# Altium footprint library THU VIEN PCB.PCBLib: 534 footprints (part 34 of 34)
Each footprint in its own frame and in the unit in brackets; x right, y up, seen from the top. Pads: shape width x height; smd on the part's side, far side on the other; paste and mask are expansions set on the pad; w line width, h text height; cw(c..) or ccw(c..) is an arc to the next point about the centre after c.
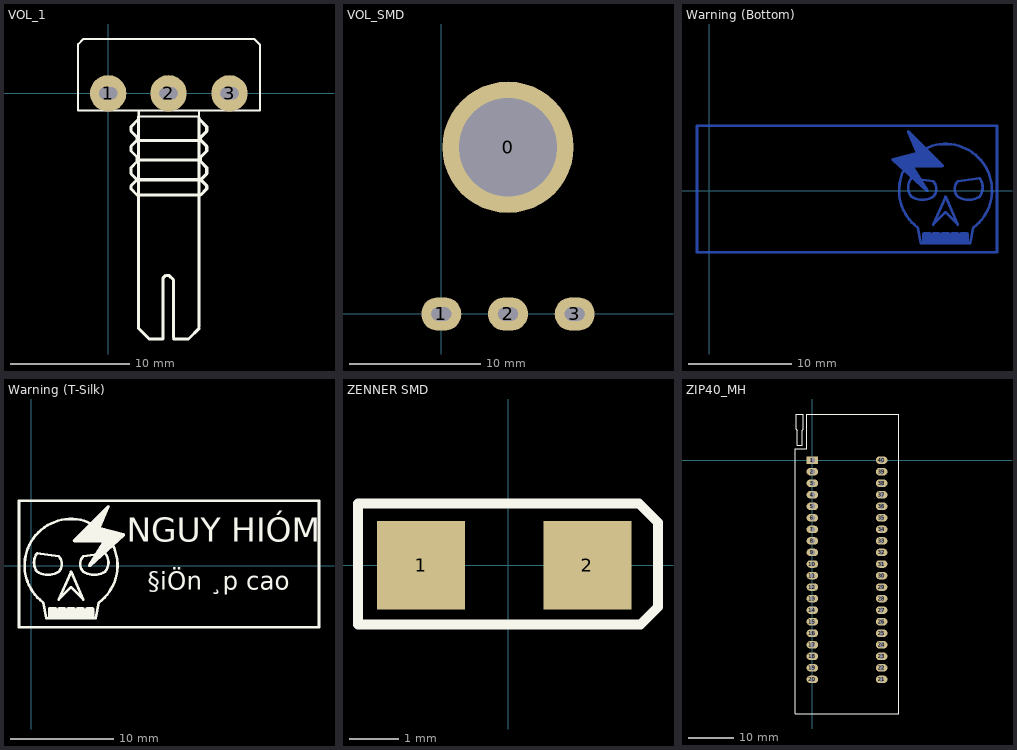
[diagram p33: the footprints below, top view; thin cyan lines are the x and y axes]

## VOL_1 [mil]
pads (3):
  round 120 hole 40 slot 60 at 0 deg: 1(0,0) 2(199,0) 3(400,0)
Top Overlay:
  lines w7: 100,-57 100,-77 299,-77 299,-57 ; 101,-77 101,-57 ; -99,-57 -99,162 -82,179 482,179 500,161 500,-57 -99,-57
  lines w10: 95,-335 75,-315 75,-305 95,-285 75,-265 75,-245 95,-225 95,-210 75,-190 75,-175 95,-155 95,-145 75,-125 75,-110 100,-85 ; 95,-220 300,-220 ; 100,-770 100,-77 ; 100,-760 100,-775 135,-810 180,-810 180,-610 190,-600 200,-600 215,-615 215,-805 ; 100,-335 305,-335 325,-315 325,-305 305,-285 ; 100,-285 305,-285 ; 105,-155 300,-155 ; 215,-810 265,-810 300,-775 ; 300,-770 300,-80 ; 300,-85 325,-110 325,-125 305,-145 305,-155 325,-175 325,-190 305,-210 305,-225 325,-245 325,-265 305,-285
3D body "SW3dPS-Pot.STEP": height 839.35, standoff -130, extent -110,-818.11 510,188.11

## VOL_SMD [mil]
pads (4):
  round 393.7 hole 295.28: 0(200,500)
  oval 120x100 hole 40 slot 60 at 0 deg: 1(0,0) 2(200,0) 3(400,0)
Bottom Overlay:
  circle w12: c200,500 r215.01
  circle w12: c0,150 r50
  circle w12: c200,150 r50
  circle w12: c400,150 r50
  lines w12: -57.25,301.71 cw(c200,500) 455.57,299.55 ; -55,299 127,299 ; -49,700 119,700 ; 281,298 455,298 ; 286,698 454,698 ; 455,295 500,250 500,-75 -100,-75 -100,255 ; -100,255 -55,300 -100,255
3D body "SW3dPS-omeg pot.STEP": height 866.14, standoff -407.48, extent -203.15,-247.08 600,947.08

## Warning (Bottom) [mm]
Bottom Layer:
  region: 19.314,5.829 19.285,5.829 19.267,5.81 19.242,5.8 19.232,5.774 19.212,5.754 19.212,5.727 19.202,5.703 19.213,5.677 19.213,5.649 20.05,3.696 17.806,3.135 17.773,3.111 17.737,3.094 17.732,3.081 17.721,3.073 17.715,3.033 17.702,2.995 17.708,2.983 17.705,2.969 17.729,2.936 17.746,2.9 21.048,-0.102 21.081,-0.114 21.11,-0.134 21.129,-0.131 21.147,-0.137 21.179,-0.122 21.213,-0.117 21.225,-0.101 21.242,-0.092 21.254,-0.059 21.274,-0.031 21.271,-0.012 21.278,0.007 21.263,0.038 21.257,0.073 19.888,2.264 22.641,2.264 22.738,2.304 22.779,2.401 22.738,2.498 19.437,5.8 19.411,5.811 19.391,5.83 19.364,5.83 19.34,5.84
  region: 24.345,-4.105 24.305,-4.202 24.305,-5.102 24.345,-5.2 24.442,-5.24 25.042,-5.24 25.139,-5.2 25.18,-5.102 25.18,-4.202 25.139,-4.105 25.042,-4.065 24.442,-4.065
  region: 21.644,-4.105 21.603,-4.202 21.603,-5.102 21.644,-5.2 21.741,-5.24 22.341,-5.24 22.438,-5.2 22.478,-5.102 22.478,-4.202 22.438,-4.105 22.341,-4.065 21.741,-4.065
  region: 20.743,-4.105 20.703,-4.202 20.703,-5.102 20.743,-5.2 20.84,-5.24 21.441,-5.24 21.538,-5.2 21.578,-5.102 21.578,-4.202 21.538,-4.105 21.441,-4.065 20.84,-4.065
  region: 23.444,-4.105 23.404,-4.202 23.404,-5.102 23.444,-5.2 23.542,-5.24 24.142,-5.24 24.239,-5.2 24.279,-5.102 24.279,-4.202 24.239,-4.105 24.142,-4.065 23.542,-4.065
  region: 22.544,-4.105 22.504,-4.202 22.504,-5.102 22.544,-5.2 22.641,-5.24 23.241,-5.24 23.338,-5.2 23.378,-5.102 23.378,-4.202 23.338,-4.105 23.241,-4.065 22.641,-4.065
  lines w0.254: -1.201,-6.003 27.94,-6.003 27.94,6.303 -1.201,6.303 -1.201,-6.003 ; 17.839,3.002 20.24,3.602 19.34,5.703 22.641,2.401 19.64,2.401 21.14,0 17.839,3.002 ; 19.64,-0.6 ccw(c20.69,1.05) 21.741,-0.6 ccw(c20.991,0.15) 21.741,0.9 19.64,1.201 ccw(c20.69,0.3) 19.64,-0.6 ; 20.24,-3.602 cw(c22.941,0.014) 25.643,-3.602 25.342,-5.102 20.54,-5.102 20.24,-3.602 ; 21.741,-3.302 22.941,-0.6 24.142,-3.302 22.941,-2.101 21.741,-3.302 ; 24.142,-0.6 cw(c24.892,0.15) 24.142,0.9 26.243,1.201 cw(c25.042,0.3) 26.243,-0.6 cw(c25.193,1.05) 24.142,-0.6
  text "§iÖn ¸p cao" at 14.732,-3.048 h3
  text "NGUY HIÓM" at 17.526,1.143 h4

## Warning (T-Silk) [mm]
Top Overlay:
  region: 4.253,-4.105 4.293,-4.202 4.293,-5.102 4.253,-5.2 4.156,-5.24 3.556,-5.24 3.459,-5.2 3.419,-5.102 3.419,-4.202 3.459,-4.105 3.556,-4.065 4.156,-4.065
  region: 3.353,-4.105 3.393,-4.202 3.393,-5.102 3.353,-5.2 3.255,-5.24 2.655,-5.24 2.558,-5.2 2.518,-5.102 2.518,-4.202 2.558,-4.105 2.655,-4.065 3.255,-4.065
  region: 6.054,-4.105 6.094,-4.202 6.094,-5.102 6.054,-5.2 5.957,-5.24 5.356,-5.24 5.259,-5.2 5.219,-5.102 5.219,-4.202 5.259,-4.105 5.356,-4.065 5.957,-4.065
  region: 5.153,-4.105 5.194,-4.202 5.194,-5.102 5.153,-5.2 5.056,-5.24 4.456,-5.24 4.359,-5.2 4.319,-5.102 4.319,-4.202 4.359,-4.105 4.456,-4.065 5.056,-4.065
  region: 2.452,-4.105 2.492,-4.202 2.492,-5.102 2.452,-5.2 2.355,-5.24 1.755,-5.24 1.658,-5.2 1.617,-5.102 1.617,-4.202 1.658,-4.105 1.755,-4.065 2.355,-4.065
  region: 7.483,5.829 7.512,5.829 7.53,5.81 7.555,5.8 7.565,5.774 7.585,5.754 7.585,5.727 7.595,5.703 7.584,5.677 7.584,5.649 6.747,3.696 8.991,3.135 9.024,3.111 9.06,3.094 9.065,3.081 9.076,3.073 9.082,3.033 9.095,2.995 9.089,2.983 9.092,2.969 9.068,2.936 9.051,2.9 5.749,-0.102 5.716,-0.114 5.687,-0.134 5.668,-0.131 5.65,-0.137 5.618,-0.122 5.584,-0.117 5.572,-0.101 5.555,-0.092 5.543,-0.059 5.523,-0.031 5.526,-0.012 5.519,0.007 5.534,0.038 5.54,0.073 6.909,2.264 4.156,2.264 4.059,2.304 4.018,2.401 4.059,2.498 7.36,5.8 7.386,5.811 7.406,5.83 7.433,5.83 7.457,5.84
  lines w0.254: -1.201,-6.003 -1.201,6.303 27.94,6.303 27.94,-6.003 -1.201,-6.003 ; 0.554,-0.6 ccw(c1.604,1.05) 2.655,-0.6 ccw(c1.905,0.15) 2.655,0.9 0.554,1.201 ccw(c1.755,0.3) 0.554,-0.6 ; 1.154,-3.602 cw(c3.856,0.014) 6.557,-3.602 6.257,-5.102 1.455,-5.102 1.154,-3.602 ; 2.655,-3.302 3.856,-0.6 5.056,-3.302 3.856,-2.101 2.655,-3.302 ; 4.156,2.401 7.457,5.703 6.557,3.602 8.958,3.002 5.657,0 7.157,2.401 4.156,2.401 ; 5.056,-0.6 cw(c5.806,0.15) 5.056,0.9 7.157,1.201 cw(c6.107,0.3) 7.157,-0.6 cw(c6.107,1.05) 5.056,-0.6
  text "NGUY HIÓM" at 9.271,1.524 h4
  text "§iÖn ¸p cao" at 11.303,-2.921 h3

## ZENNER SMD [mil]
pads (2):
  rect 70x70 smd: 1(-69,0) 2(63,0)
Top Overlay:
  lines w7.87: -119,-47 105,-47 119,-33 119,-6.54 119,34 104,49 -119,49 -119,-47
3D body "User Library-SOD80C-1.STEP": height 62.99, standoff 0, extent -71.83,-32 73.83,30.99

## ZIP40_MH [mil] "40 PIN, W 900 mil , L 2600 mil , Push Pro FOR Chip"
height 300
pads (40):
  rect 100x65 hole 45: 1(0,0)
  oval 100x65 hole 45: 2(0,-100) 3(0,-200) 4(0,-300) 5(0,-400) 6(0,-500) 7(0,-600) 8(0,-700) 9(0,-800) 10(0,-900) 11(0,-1000) 12(0,-1100) 13(0,-1200) 14(0,-1300) 15(0,-1400) 16(0,-1500) 17(0,-1600) 18(0,-1700) 19(0,-1800) 20(0,-1900) 21(600,-1900) 22(600,-1800) 23(600,-1700) 24(600,-1600) 25(600,-1500) 26(600,-1400) 27(600,-1300) 28(600,-1200) 29(600,-1100) 30(600,-1000) 31(600,-900) 32(600,-800) 33(600,-700) 34(600,-600) 35(600,-500) 36(600,-400) 37(600,-300) 38(600,-200) 39(600,-100) 40(600,0)
Top Overlay:
  lines w7: -150,100 -150,-2200 750,-2200 750,400 600,400 50,400
  lines w7.01: -150,100 -50,100 -50,400 50,400 ; -140,270 -140,400 -80,400 -80,270 -90,260 -90,130 -110,130 -130,130 -130,260 -140,270
3D body "SW3dPS-zif.STEP": height 443.07, standoff -186.85, extent -189.6,-2144.51 750,894.51